# Altium integrated library Weidmueller_OMNIMATE_Power.IntLib: 508 symbols (part 7 of 9) (continued)
## 1851060000_Single (continued)
OMNIMATE Power - series BU/SU 10.16HP; PartNumber: 1851060000; Manufacturer: Weidmueller; Short_text_for_material: SU 10.16HP/04/90SF 3.5AG BK BX; Side_termination_characteristic: Screw/clip-on flange; Mounting_onto_the_PCB: Solder connection; Pitch_mm: 10.16 mm; Pitch_inch: 0.4 inch; No_of_poles: 4; Outgoing_elbow: 90°; Solder_pin_length_mm: 3.5 mm; Contact_material: Cu-Leg; Contact_surface: silver-plated; Insulating_material: PBT GF; UL_94_flammability_rating: V-0; Rated_voltage_for_surge_voltage_class_pollution_degree_II_2: 1000 V; Rated_current_min_no_of_poles_TU_20_deg_C: 19 A; Rated_voltage_use_group_B_UL_1059: 300 V; Rated_current_use_group_B_UL_1059: 54 A; PackageReference: SU_10_16HP_90SF_04; Colour: Black; Packaging: Box; Qty: 50 PCS; Revision: V1; ComponentLink1Description: Manufacturer URL; ComponentLink1URL: http://www.weidmueller.com/; ComponentLink2Description: URL Link1; ComponentLink2URL: http://catalog.weidmueller.com/catalog/Start.do?localeId=en&ObjectID=1851060000
footprint SU_10_16HP_90SF_04 (OMNIMATE Power - Serie BU/SU 10.16HP  SU 10.16HP/04/90SF 3.5)
part A pins: A1
part B pins: A2
part C pins: A3
part D pins: A4

## 1851100000
designator J?
OMNIMATE Power - series BU/SU 10.16HP; PartNumber: 1851100000; Manufacturer: Weidmueller; Short_text_for_material: SU 10.16HP/08/90SF 3.5AG BK BX; Side_termination_characteristic: Screw/clip-on flange; Mounting_onto_the_PCB: Solder connection; Pitch_mm: 10.16 mm; Pitch_inch: 0.4 inch; No_of_poles: 8; Outgoing_elbow: 90°; Solder_pin_length_mm: 3.5 mm; Contact_material: Cu-Leg; Contact_surface: silver-plated; Insulating_material: PBT GF; UL_94_flammability_rating: V-0; Rated_voltage_for_surge_voltage_class_pollution_degree_II_2: 1000 V; Rated_current_min_no_of_poles_TU_20_deg_C: 19 A; Rated_voltage_use_group_B_UL_1059: 300 V; Rated_current_use_group_B_UL_1059: 54 A; PackageReference: SU_10_16HP_90SF_08; Colour: Black; Packaging: Box; Qty: 20 PCS; Revision: V1; ComponentLink1Description: Manufacturer URL; ComponentLink1URL: http://www.weidmueller.com/; ComponentLink2Description: URL Link1; ComponentLink2URL: http://catalog.weidmueller.com/catalog/Start.do?localeId=en&ObjectID=1851100000
footprint SU_10_16HP_90SF_08 (OMNIMATE Power - Serie BU/SU 10.16HP  SU 10.16HP/08/90SF 3.5)
pins: A1, A2, A3, A4, A5, A6, A7, A8

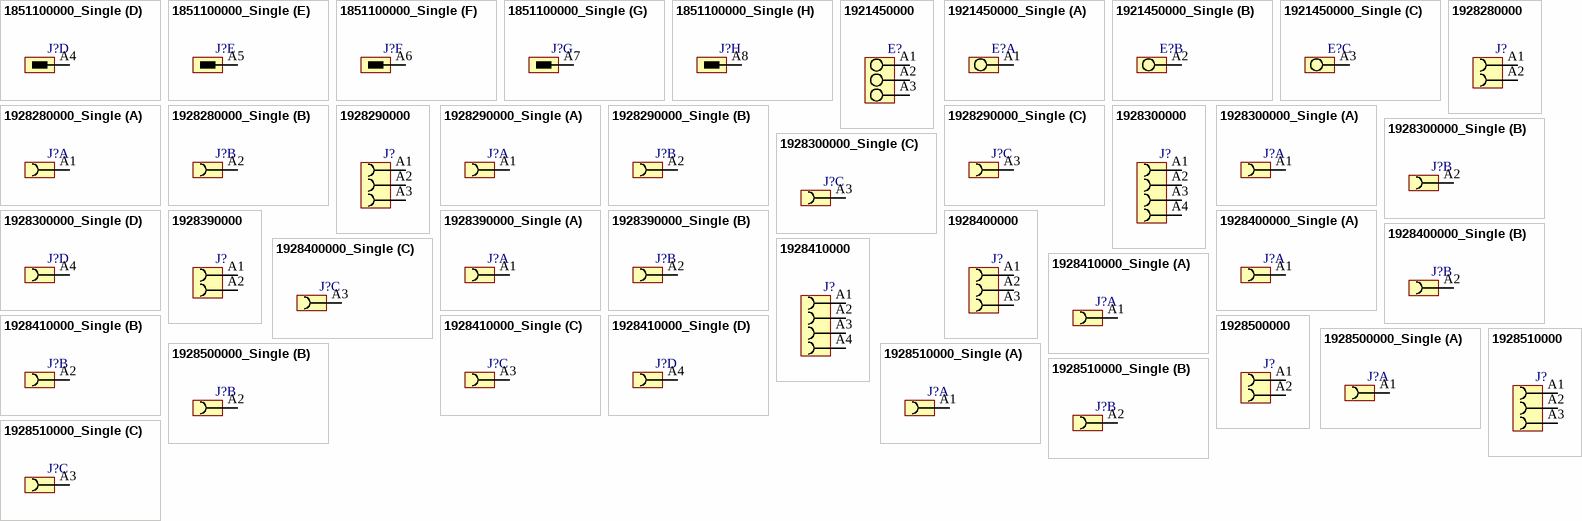
[diagram p25: symbols 1851100000_Single to 1928510000_Single]

## 1851100000_Single
designator J?
OMNIMATE Power - series BU/SU 10.16HP; PartNumber: 1851100000; Manufacturer: Weidmueller; Short_text_for_material: SU 10.16HP/08/90SF 3.5AG BK BX; Side_termination_characteristic: Screw/clip-on flange; Mounting_onto_the_PCB: Solder connection; Pitch_mm: 10.16 mm; Pitch_inch: 0.4 inch; No_of_poles: 8; Outgoing_elbow: 90°; Solder_pin_length_mm: 3.5 mm; Contact_material: Cu-Leg; Contact_surface: silver-plated; Insulating_material: PBT GF; UL_94_flammability_rating: V-0; Rated_voltage_for_surge_voltage_class_pollution_degree_II_2: 1000 V; Rated_current_min_no_of_poles_TU_20_deg_C: 19 A; Rated_voltage_use_group_B_UL_1059: 300 V; Rated_current_use_group_B_UL_1059: 54 A; PackageReference: SU_10_16HP_90SF_08; Colour: Black; Packaging: Box; Qty: 20 PCS; Revision: V1; ComponentLink1Description: Manufacturer URL; ComponentLink1URL: http://www.weidmueller.com/; ComponentLink2Description: URL Link1; ComponentLink2URL: http://catalog.weidmueller.com/catalog/Start.do?localeId=en&ObjectID=1851100000
footprint SU_10_16HP_90SF_08 (OMNIMATE Power - Serie BU/SU 10.16HP  SU 10.16HP/08/90SF 3.5)
part A pins: A1
part B pins: A2
part C pins: A3
part D pins: A4
part E pins: A5
part F pins: A6
part G pins: A7
part H pins: A8

## 1921450000
designator E?
OMNIMATE Power - series LU; PartNumber: 1921450000; Manufacturer: Weidmueller; Short_text_for_material: LU 10.16/03/90 4.5SN BK BX; Side_termination_characteristic: closed side; Mounting_onto_the_PCB: Solder connection; Pitch_mm: 10,16 mm; Pitch_inch: 0,4 inch; No_of_poles: 3; Solder_pin_length_mm: 4,5 mm; Contact_material: E-Cu; Contact_surface: tinned; Insulating_material: Wemid (PA); UL_94_flammability_rating: V-0; Rated_voltage_for_surge_voltage_class_pollution_degree_II_2: 1000 V; Solid_min_H05_07_V_U: 0,5 mm²; Solid_max_H05_07_V_U: 16 mm²; Rated_voltage_use_group_B_UL_1059: 300 V; Rated_current_use_group_B_UL_1059: 65 A; Wire_cross_section_AWG_min_UL_1059: AWG 26; Wire_cross_section_AWG_max_UL_1059: AWG 6; PackageReference: LU_10_16_90_03; Colour: Black; Packaging: Box; Qty: 20 PCS; Revision: V1; ComponentLink1Description: Manufacturer URL; ComponentLink1URL: http://www.weidmueller.com/; ComponentLink2Description: URL Link1; ComponentLink2URL: http://catalog.weidmueller.com/catalog/Start.do?localeId=en&ObjectID=1921450000
footprint LU_10_16_90_03 (OMNIMATE Power - Serie LU  LU 10.16/03/90 4.5)
pins: A1, A2, A3
1 alternate drawing of the same symbol

## 1921450000_Single
designator E?
OMNIMATE Power - series LU; PartNumber: 1921450000; Manufacturer: Weidmueller; Short_text_for_material: LU 10.16/03/90 4.5SN BK BX; Side_termination_characteristic: closed side; Mounting_onto_the_PCB: Solder connection; Pitch_mm: 10,16 mm; Pitch_inch: 0,4 inch; No_of_poles: 3; Solder_pin_length_mm: 4,5 mm; Contact_material: E-Cu; Contact_surface: tinned; Insulating_material: Wemid (PA); UL_94_flammability_rating: V-0; Rated_voltage_for_surge_voltage_class_pollution_degree_II_2: 1000 V; Solid_min_H05_07_V_U: 0,5 mm²; Solid_max_H05_07_V_U: 16 mm²; Rated_voltage_use_group_B_UL_1059: 300 V; Rated_current_use_group_B_UL_1059: 65 A; Wire_cross_section_AWG_min_UL_1059: AWG 26; Wire_cross_section_AWG_max_UL_1059: AWG 6; PackageReference: LU_10_16_90_03; Colour: Black; Packaging: Box; Qty: 20 PCS; Revision: V1; ComponentLink1Description: Manufacturer URL; ComponentLink1URL: http://www.weidmueller.com/; ComponentLink2Description: URL Link1; ComponentLink2URL: http://catalog.weidmueller.com/catalog/Start.do?localeId=en&ObjectID=1921450000
footprint LU_10_16_90_03 (OMNIMATE Power - Serie LU  LU 10.16/03/90 4.5)
part A pins: A1
part B pins: A2
part C pins: A3
1 alternate drawing of the same symbol

## 1928280000
designator J?
OMNIMATE Power - series BV/SV 7.62HP; PartNumber: 1928280000; Manufacturer: Weidmueller; Short_text_for_material: BVL 7.62HP/02/90 3.5SN BK BX; Side_termination_characteristic: closed side; Mounting_onto_the_PCB: Solder connection; Pitch_mm: 7.62 mm; Pitch_inch: 0.3 inch; No_of_poles: 2; Outgoing_elbow: 90°; Solder_pin_length_mm: 3.5 mm; Contact_material: Cu-Leg; Contact_surface: tinned; Insulating_material: PA GF; UL_94_flammability_rating: V-0; Rated_voltage_for_surge_voltage_class_pollution_degree_II_2: 1000 V; Rated_voltage_use_group_B_UL_1059: 300 V; Rated_current_use_group_B_UL_1059: 35 A; PackageReference: BVL_7_62HP_90_02; Colour: Black; Packaging: Box; Qty: 100 PCS; Revision: V1; ComponentLink1Description: Manufacturer URL; ComponentLink1URL: http://www.weidmueller.com/; ComponentLink2Description: URL Link1; ComponentLink2URL: http://catalog.weidmueller.com/catalog/Start.do?localeId=en&ObjectID=1928280000
footprint BVL_7_62HP_90_02 (OMNIMATE Power - Serie BV/SV 7.62HP  BVL 7.62HP/02/90 3.5)
pins: A1, A2

## 1928280000_Single
designator J?
OMNIMATE Power - series BV/SV 7.62HP; PartNumber: 1928280000; Manufacturer: Weidmueller; Short_text_for_material: BVL 7.62HP/02/90 3.5SN BK BX; Side_termination_characteristic: closed side; Mounting_onto_the_PCB: Solder connection; Pitch_mm: 7.62 mm; Pitch_inch: 0.3 inch; No_of_poles: 2; Outgoing_elbow: 90°; Solder_pin_length_mm: 3.5 mm; Contact_material: Cu-Leg; Contact_surface: tinned; Insulating_material: PA GF; UL_94_flammability_rating: V-0; Rated_voltage_for_surge_voltage_class_pollution_degree_II_2: 1000 V; Rated_voltage_use_group_B_UL_1059: 300 V; Rated_current_use_group_B_UL_1059: 35 A; PackageReference: BVL_7_62HP_90_02; Colour: Black; Packaging: Box; Qty: 100 PCS; Revision: V1; ComponentLink1Description: Manufacturer URL; ComponentLink1URL: http://www.weidmueller.com/; ComponentLink2Description: URL Link1; ComponentLink2URL: http://catalog.weidmueller.com/catalog/Start.do?localeId=en&ObjectID=1928280000
footprint BVL_7_62HP_90_02 (OMNIMATE Power - Serie BV/SV 7.62HP  BVL 7.62HP/02/90 3.5)
part A pins: A1
part B pins: A2

## 1928290000
designator J?
OMNIMATE Power - series BV/SV 7.62HP; PartNumber: 1928290000; Manufacturer: Weidmueller; Short_text_for_material: BVL 7.62HP/03/90 3.5SN BK BX; Side_termination_characteristic: closed side; Mounting_onto_the_PCB: Solder connection; Pitch_mm: 7.62 mm; Pitch_inch: 0.3 inch; No_of_poles: 3; Outgoing_elbow: 90°; Solder_pin_length_mm: 3.5 mm; Contact_material: Cu-Leg; Contact_surface: tinned; Insulating_material: PA GF; UL_94_flammability_rating: V-0; Rated_voltage_for_surge_voltage_class_pollution_degree_II_2: 1000 V; Rated_voltage_use_group_B_UL_1059: 300 V; Rated_current_use_group_B_UL_1059: 35 A; PackageReference: BVL_7_62HP_90_03; Colour: Black; Packaging: Box; Qty: 100 PCS; Revision: V1; ComponentLink1Description: Manufacturer URL; ComponentLink1URL: http://www.weidmueller.com/; ComponentLink2Description: URL Link1; ComponentLink2URL: http://catalog.weidmueller.com/catalog/Start.do?localeId=en&ObjectID=1928290000
footprint BVL_7_62HP_90_03 (OMNIMATE Power - Serie BV/SV 7.62HP  BVL 7.62HP/03/90 3.5)
pins: A1, A2, A3

## 1928290000_Single
designator J?
OMNIMATE Power - series BV/SV 7.62HP; PartNumber: 1928290000; Manufacturer: Weidmueller; Short_text_for_material: BVL 7.62HP/03/90 3.5SN BK BX; Side_termination_characteristic: closed side; Mounting_onto_the_PCB: Solder connection; Pitch_mm: 7.62 mm; Pitch_inch: 0.3 inch; No_of_poles: 3; Outgoing_elbow: 90°; Solder_pin_length_mm: 3.5 mm; Contact_material: Cu-Leg; Contact_surface: tinned; Insulating_material: PA GF; UL_94_flammability_rating: V-0; Rated_voltage_for_surge_voltage_class_pollution_degree_II_2: 1000 V; Rated_voltage_use_group_B_UL_1059: 300 V; Rated_current_use_group_B_UL_1059: 35 A; PackageReference: BVL_7_62HP_90_03; Colour: Black; Packaging: Box; Qty: 100 PCS; Revision: V1; ComponentLink1Description: Manufacturer URL; ComponentLink1URL: http://www.weidmueller.com/; ComponentLink2Description: URL Link1; ComponentLink2URL: http://catalog.weidmueller.com/catalog/Start.do?localeId=en&ObjectID=1928290000
footprint BVL_7_62HP_90_03 (OMNIMATE Power - Serie BV/SV 7.62HP  BVL 7.62HP/03/90 3.5)
part A pins: A1
part B pins: A2
part C pins: A3

## 1928300000
designator J?
OMNIMATE Power - series BV/SV 7.62HP; PartNumber: 1928300000; Manufacturer: Weidmueller; Short_text_for_material: BVL 7.62HP/04/90 3.5SN BK BX; Side_termination_characteristic: closed side; Mounting_onto_the_PCB: Solder connection; Pitch_mm: 7.62 mm; Pitch_inch: 0.3 inch; No_of_poles: 4; Outgoing_elbow: 90°; Solder_pin_length_mm: 3.5 mm; Contact_material: Cu-Leg; Contact_surface: tinned; Insulating_material: PA GF; UL_94_flammability_rating: V-0; Rated_voltage_for_surge_voltage_class_pollution_degree_II_2: 1000 V; Rated_voltage_use_group_B_UL_1059: 300 V; Rated_current_use_group_B_UL_1059: 35 A; PackageReference: BVL_7_62HP_90_04; Colour: Black; Packaging: Box; Qty: 100 PCS; Revision: V1; ComponentLink1Description: Manufacturer URL; ComponentLink1URL: http://www.weidmueller.com/; ComponentLink2Description: URL Link1; ComponentLink2URL: http://catalog.weidmueller.com/catalog/Start.do?localeId=en&ObjectID=1928300000
footprint BVL_7_62HP_90_04 (OMNIMATE Power - Serie BV/SV 7.62HP  BVL 7.62HP/04/90 3.5)
pins: A1, A2, A3, A4

## 1928300000_Single
designator J?
OMNIMATE Power - series BV/SV 7.62HP; PartNumber: 1928300000; Manufacturer: Weidmueller; Short_text_for_material: BVL 7.62HP/04/90 3.5SN BK BX; Side_termination_characteristic: closed side; Mounting_onto_the_PCB: Solder connection; Pitch_mm: 7.62 mm; Pitch_inch: 0.3 inch; No_of_poles: 4; Outgoing_elbow: 90°; Solder_pin_length_mm: 3.5 mm; Contact_material: Cu-Leg; Contact_surface: tinned; Insulating_material: PA GF; UL_94_flammability_rating: V-0; Rated_voltage_for_surge_voltage_class_pollution_degree_II_2: 1000 V; Rated_voltage_use_group_B_UL_1059: 300 V; Rated_current_use_group_B_UL_1059: 35 A; PackageReference: BVL_7_62HP_90_04; Colour: Black; Packaging: Box; Qty: 100 PCS; Revision: V1; ComponentLink1Description: Manufacturer URL; ComponentLink1URL: http://www.weidmueller.com/; ComponentLink2Description: URL Link1; ComponentLink2URL: http://catalog.weidmueller.com/catalog/Start.do?localeId=en&ObjectID=1928300000
footprint BVL_7_62HP_90_04 (OMNIMATE Power - Serie BV/SV 7.62HP  BVL 7.62HP/04/90 3.5)
part A pins: A1
part B pins: A2
part C pins: A3
part D pins: A4

## 1928390000
designator J?
OMNIMATE Power - series BV/SV 7.62HP; PartNumber: 1928390000; Manufacturer: Weidmueller; Short_text_for_material: BVL 7.62HP/02/90FI 3.5SN BK BX; Side_termination_characteristic: Clip-on flange, inverted; Mounting_onto_the_PCB: Solder connection; Pitch_mm: 7.62 mm; Pitch_inch: 0.3 inch; No_of_poles: 2; Outgoing_elbow: 90°; Solder_pin_length_mm: 3.5 mm; Contact_material: Cu-Leg; Contact_surface: tinned; Insulating_material: PA GF; UL_94_flammability_rating: V-0; Rated_voltage_for_surge_voltage_class_pollution_degree_II_2: 1000 V; Rated_voltage_use_group_B_UL_1059: 300 V; Rated_current_use_group_B_UL_1059: 35 A; PackageReference: BVL_7_62HP_90FI_02; Colour: Black; Packaging: Box; Qty: 100 PCS; Revision: V1; ComponentLink1Description: Manufacturer URL; ComponentLink1URL: http://www.weidmueller.com/; ComponentLink2Description: URL Link1; ComponentLink2URL: http://catalog.weidmueller.com/catalog/Start.do?localeId=en&ObjectID=1928390000
footprint BVL_7_62HP_90FI_02 (OMNIMATE Power - Serie BV/SV 7.62HP  BVL 7.62HP/02/90FI 3.5)
pins: A1, A2

## 1928390000_Single
designator J?
OMNIMATE Power - series BV/SV 7.62HP; PartNumber: 1928390000; Manufacturer: Weidmueller; Short_text_for_material: BVL 7.62HP/02/90FI 3.5SN BK BX; Side_termination_characteristic: Clip-on flange, inverted; Mounting_onto_the_PCB: Solder connection; Pitch_mm: 7.62 mm; Pitch_inch: 0.3 inch; No_of_poles: 2; Outgoing_elbow: 90°; Solder_pin_length_mm: 3.5 mm; Contact_material: Cu-Leg; Contact_surface: tinned; Insulating_material: PA GF; UL_94_flammability_rating: V-0; Rated_voltage_for_surge_voltage_class_pollution_degree_II_2: 1000 V; Rated_voltage_use_group_B_UL_1059: 300 V; Rated_current_use_group_B_UL_1059: 35 A; PackageReference: BVL_7_62HP_90FI_02; Colour: Black; Packaging: Box; Qty: 100 PCS; Revision: V1; ComponentLink1Description: Manufacturer URL; ComponentLink1URL: http://www.weidmueller.com/; ComponentLink2Description: URL Link1; ComponentLink2URL: http://catalog.weidmueller.com/catalog/Start.do?localeId=en&ObjectID=1928390000
footprint BVL_7_62HP_90FI_02 (OMNIMATE Power - Serie BV/SV 7.62HP  BVL 7.62HP/02/90FI 3.5)
part A pins: A1
part B pins: A2

## 1928400000
designator J?
OMNIMATE Power - series BV/SV 7.62HP; PartNumber: 1928400000; Manufacturer: Weidmueller; Short_text_for_material: BVL 7.62HP/03/90FI 3.5SN BK BX; Side_termination_characteristic: Clip-on flange, inverted; Mounting_onto_the_PCB: Solder connection; Pitch_mm: 7.62 mm; Pitch_inch: 0.3 inch; No_of_poles: 3; Outgoing_elbow: 90°; Solder_pin_length_mm: 3.5 mm; Contact_material: Cu-Leg; Contact_surface: tinned; Insulating_material: PA GF; UL_94_flammability_rating: V-0; Rated_voltage_for_surge_voltage_class_pollution_degree_II_2: 1000 V; Rated_voltage_use_group_B_UL_1059: 300 V; Rated_current_use_group_B_UL_1059: 35 A; PackageReference: BVL_7_62HP_90FI_03; Colour: Black; Packaging: Box; Qty: 100 PCS; Revision: V1; ComponentLink1Description: Manufacturer URL; ComponentLink1URL: http://www.weidmueller.com/; ComponentLink2Description: URL Link1; ComponentLink2URL: http://catalog.weidmueller.com/catalog/Start.do?localeId=en&ObjectID=1928400000
footprint BVL_7_62HP_90FI_03 (OMNIMATE Power - Serie BV/SV 7.62HP  BVL 7.62HP/03/90FI 3.5)
pins: A1, A2, A3

## 1928400000_Single
designator J?
OMNIMATE Power - series BV/SV 7.62HP; PartNumber: 1928400000; Manufacturer: Weidmueller; Short_text_for_material: BVL 7.62HP/03/90FI 3.5SN BK BX; Side_termination_characteristic: Clip-on flange, inverted; Mounting_onto_the_PCB: Solder connection; Pitch_mm: 7.62 mm; Pitch_inch: 0.3 inch; No_of_poles: 3; Outgoing_elbow: 90°; Solder_pin_length_mm: 3.5 mm; Contact_material: Cu-Leg; Contact_surface: tinned; Insulating_material: PA GF; UL_94_flammability_rating: V-0; Rated_voltage_for_surge_voltage_class_pollution_degree_II_2: 1000 V; Rated_voltage_use_group_B_UL_1059: 300 V; Rated_current_use_group_B_UL_1059: 35 A; PackageReference: BVL_7_62HP_90FI_03; Colour: Black; Packaging: Box; Qty: 100 PCS; Revision: V1; ComponentLink1Description: Manufacturer URL; ComponentLink1URL: http://www.weidmueller.com/; ComponentLink2Description: URL Link1; ComponentLink2URL: http://catalog.weidmueller.com/catalog/Start.do?localeId=en&ObjectID=1928400000
footprint BVL_7_62HP_90FI_03 (OMNIMATE Power - Serie BV/SV 7.62HP  BVL 7.62HP/03/90FI 3.5)
part A pins: A1
part B pins: A2
part C pins: A3

## 1928410000
designator J?
OMNIMATE Power - series BV/SV 7.62HP; PartNumber: 1928410000; Manufacturer: Weidmueller; Short_text_for_material: BVL 7.62HP/04/90FI 3.5SN BK BX; Side_termination_characteristic: Clip-on flange, inverted; Mounting_onto_the_PCB: Solder connection; Pitch_mm: 7.62 mm; Pitch_inch: 0.3 inch; No_of_poles: 4; Outgoing_elbow: 90°; Solder_pin_length_mm: 3.5 mm; Contact_material: Cu-Leg; Contact_surface: tinned; Insulating_material: PA GF; UL_94_flammability_rating: V-0; Rated_voltage_for_surge_voltage_class_pollution_degree_II_2: 1000 V; Rated_voltage_use_group_B_UL_1059: 300 V; Rated_current_use_group_B_UL_1059: 35 A; PackageReference: BVL_7_62HP_90FI_04; Colour: Black; Packaging: Box; Qty: 100 PCS; Revision: V1; ComponentLink1Description: Manufacturer URL; ComponentLink1URL: http://www.weidmueller.com/; ComponentLink2Description: URL Link1; ComponentLink2URL: http://catalog.weidmueller.com/catalog/Start.do?localeId=en&ObjectID=1928410000
footprint BVL_7_62HP_90FI_04 (OMNIMATE Power - Serie BV/SV 7.62HP  BVL 7.62HP/04/90FI 3.5)
pins: A1, A2, A3, A4

## 1928410000_Single
designator J?
OMNIMATE Power - series BV/SV 7.62HP; PartNumber: 1928410000; Manufacturer: Weidmueller; Short_text_for_material: BVL 7.62HP/04/90FI 3.5SN BK BX; Side_termination_characteristic: Clip-on flange, inverted; Mounting_onto_the_PCB: Solder connection; Pitch_mm: 7.62 mm; Pitch_inch: 0.3 inch; No_of_poles: 4; Outgoing_elbow: 90°; Solder_pin_length_mm: 3.5 mm; Contact_material: Cu-Leg; Contact_surface: tinned; Insulating_material: PA GF; UL_94_flammability_rating: V-0; Rated_voltage_for_surge_voltage_class_pollution_degree_II_2: 1000 V; Rated_voltage_use_group_B_UL_1059: 300 V; Rated_current_use_group_B_UL_1059: 35 A; PackageReference: BVL_7_62HP_90FI_04; Colour: Black; Packaging: Box; Qty: 100 PCS; Revision: V1; ComponentLink1Description: Manufacturer URL; ComponentLink1URL: http://www.weidmueller.com/; ComponentLink2Description: URL Link1; ComponentLink2URL: http://catalog.weidmueller.com/catalog/Start.do?localeId=en&ObjectID=1928410000
footprint BVL_7_62HP_90FI_04 (OMNIMATE Power - Serie BV/SV 7.62HP  BVL 7.62HP/04/90FI 3.5)
part A pins: A1
part B pins: A2
part C pins: A3
part D pins: A4

## 1928500000
designator J?
OMNIMATE Power - series BV/SV 7.62HP; PartNumber: 1928500000; Manufacturer: Weidmueller; Short_text_for_material: BVL 7.62HP/02/90SFI 3.5SN BK BX; Side_termination_characteristic: Screw/clip-on flange, reversed; Mounting_onto_the_PCB: Solder connection; Pitch_mm: 7.62 mm; Pitch_inch: 0.3 inch; No_of_poles: 2; Outgoing_elbow: 90°; Solder_pin_length_mm: 3.5 mm; Contact_material: Cu-Leg; Contact_surface: tinned; Insulating_material: PA GF; UL_94_flammability_rating: V-0; Rated_voltage_for_surge_voltage_class_pollution_degree_II_2: 1000 V; Rated_voltage_use_group_B_UL_1059: 300 V; Rated_current_use_group_B_UL_1059: 35 A; PackageReference: BVL_7_62HP_90SFI_02; Colour: Black; Packaging: Box; Qty: 100 PCS; Revision: V1; ComponentLink1Description: Manufacturer URL; ComponentLink1URL: http://www.weidmueller.com/; ComponentLink2Description: URL Link1; ComponentLink2URL: http://catalog.weidmueller.com/catalog/Start.do?localeId=en&ObjectID=1928500000
footprint BVL_7_62HP_90SFI_02 (OMNIMATE Power - Serie BV/SV 7.62HP  BVL 7.62HP/02/90SFI 3.5)
pins: A1, A2

## 1928500000_Single
designator J?
OMNIMATE Power - series BV/SV 7.62HP; PartNumber: 1928500000; Manufacturer: Weidmueller; Short_text_for_material: BVL 7.62HP/02/90SFI 3.5SN BK BX; Side_termination_characteristic: Screw/clip-on flange, reversed; Mounting_onto_the_PCB: Solder connection; Pitch_mm: 7.62 mm; Pitch_inch: 0.3 inch; No_of_poles: 2; Outgoing_elbow: 90°; Solder_pin_length_mm: 3.5 mm; Contact_material: Cu-Leg; Contact_surface: tinned; Insulating_material: PA GF; UL_94_flammability_rating: V-0; Rated_voltage_for_surge_voltage_class_pollution_degree_II_2: 1000 V; Rated_voltage_use_group_B_UL_1059: 300 V; Rated_current_use_group_B_UL_1059: 35 A; PackageReference: BVL_7_62HP_90SFI_02; Colour: Black; Packaging: Box; Qty: 100 PCS; Revision: V1; ComponentLink1Description: Manufacturer URL; ComponentLink1URL: http://www.weidmueller.com/; ComponentLink2Description: URL Link1; ComponentLink2URL: http://catalog.weidmueller.com/catalog/Start.do?localeId=en&ObjectID=1928500000
footprint BVL_7_62HP_90SFI_02 (OMNIMATE Power - Serie BV/SV 7.62HP  BVL 7.62HP/02/90SFI 3.5)
part A pins: A1
part B pins: A2

## 1928510000
designator J?
OMNIMATE Power - series BV/SV 7.62HP; PartNumber: 1928510000; Manufacturer: Weidmueller; Short_text_for_material: BVL 7.62HP/03/90SFI 3.5SN BK BX; Side_termination_characteristic: Screw/clip-on flange, reversed; Mounting_onto_the_PCB: Solder connection; Pitch_mm: 7.62 mm; Pitch_inch: 0.3 inch; No_of_poles: 3; Outgoing_elbow: 90°; Solder_pin_length_mm: 3.5 mm; Contact_material: Cu-Leg; Contact_surface: tinned; Insulating_material: PA GF; UL_94_flammability_rating: V-0; Rated_voltage_for_surge_voltage_class_pollution_degree_II_2: 1000 V; Rated_voltage_use_group_B_UL_1059: 300 V; Rated_current_use_group_B_UL_1059: 35 A; PackageReference: BVL_7_62HP_90SFI_03; Colour: Black; Packaging: Box; Qty: 100 PCS; Revision: V1; ComponentLink1Description: Manufacturer URL; ComponentLink1URL: http://www.weidmueller.com/; ComponentLink2Description: URL Link1; ComponentLink2URL: http://catalog.weidmueller.com/catalog/Start.do?localeId=en&ObjectID=1928510000
footprint BVL_7_62HP_90SFI_03 (OMNIMATE Power - Serie BV/SV 7.62HP  BVL 7.62HP/03/90SFI 3.5)
pins: A1, A2, A3

## 1928510000_Single
designator J?
OMNIMATE Power - series BV/SV 7.62HP; PartNumber: 1928510000; Manufacturer: Weidmueller; Short_text_for_material: BVL 7.62HP/03/90SFI 3.5SN BK BX; Side_termination_characteristic: Screw/clip-on flange, reversed; Mounting_onto_the_PCB: Solder connection; Pitch_mm: 7.62 mm; Pitch_inch: 0.3 inch; No_of_poles: 3; Outgoing_elbow: 90°; Solder_pin_length_mm: 3.5 mm; Contact_material: Cu-Leg; Contact_surface: tinned; Insulating_material: PA GF; UL_94_flammability_rating: V-0; Rated_voltage_for_surge_voltage_class_pollution_degree_II_2: 1000 V; Rated_voltage_use_group_B_UL_1059: 300 V; Rated_current_use_group_B_UL_1059: 35 A; PackageReference: BVL_7_62HP_90SFI_03; Colour: Black; Packaging: Box; Qty: 100 PCS; Revision: V1; ComponentLink1Description: Manufacturer URL; ComponentLink1URL: http://www.weidmueller.com/; ComponentLink2Description: URL Link1; ComponentLink2URL: http://catalog.weidmueller.com/catalog/Start.do?localeId=en&ObjectID=1928510000
footprint BVL_7_62HP_90SFI_03 (OMNIMATE Power - Serie BV/SV 7.62HP  BVL 7.62HP/03/90SFI 3.5)
part A pins: A1
part B pins: A2
part C pins: A3

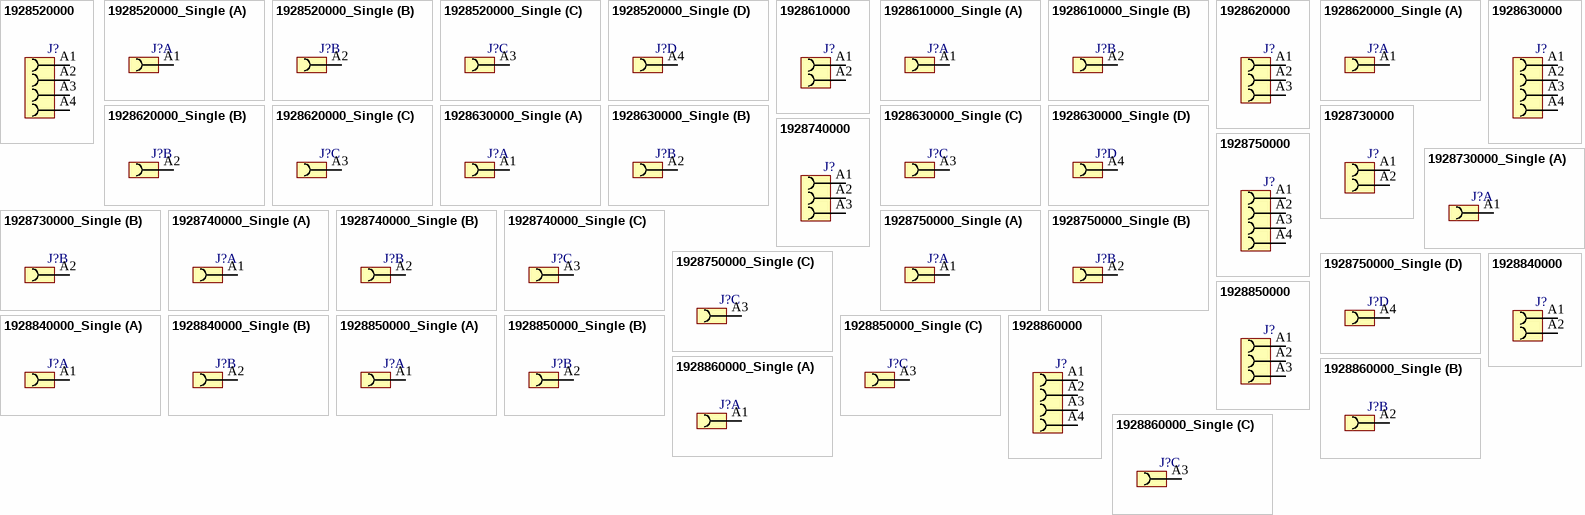
[diagram p26: symbols 1928520000 to 1928860000_Single]

## 1928520000
designator J?
OMNIMATE Power - series BV/SV 7.62HP; PartNumber: 1928520000; Manufacturer: Weidmueller; Short_text_for_material: BVL 7.62HP/04/90SFI 3.5SN BK BX; Side_termination_characteristic: Screw/clip-on flange, reversed; Mounting_onto_the_PCB: Solder connection; Pitch_mm: 7.62 mm; Pitch_inch: 0.3 inch; No_of_poles: 4; Outgoing_elbow: 90°; Solder_pin_length_mm: 3.5 mm; Contact_material: Cu-Leg; Contact_surface: tinned; Insulating_material: PA GF; UL_94_flammability_rating: V-0; Rated_voltage_for_surge_voltage_class_pollution_degree_II_2: 1000 V; Rated_voltage_use_group_B_UL_1059: 300 V; Rated_current_use_group_B_UL_1059: 35 A; PackageReference: BVL_7_62HP_90SFI_04; Colour: Black; Packaging: Box; Qty: 100 PCS; Revision: V1; ComponentLink1Description: Manufacturer URL; ComponentLink1URL: http://www.weidmueller.com/; ComponentLink2Description: URL Link1; ComponentLink2URL: http://catalog.weidmueller.com/catalog/Start.do?localeId=en&ObjectID=1928520000
footprint BVL_7_62HP_90SFI_04 (OMNIMATE Power - Serie BV/SV 7.62HP  BVL 7.62HP/04/90SFI 3.5)
pins: A1, A2, A3, A4

## 1928520000_Single
designator J?
OMNIMATE Power - series BV/SV 7.62HP; PartNumber: 1928520000; Manufacturer: Weidmueller; Short_text_for_material: BVL 7.62HP/04/90SFI 3.5SN BK BX; Side_termination_characteristic: Screw/clip-on flange, reversed; Mounting_onto_the_PCB: Solder connection; Pitch_mm: 7.62 mm; Pitch_inch: 0.3 inch; No_of_poles: 4; Outgoing_elbow: 90°; Solder_pin_length_mm: 3.5 mm; Contact_material: Cu-Leg; Contact_surface: tinned; Insulating_material: PA GF; UL_94_flammability_rating: V-0; Rated_voltage_for_surge_voltage_class_pollution_degree_II_2: 1000 V; Rated_voltage_use_group_B_UL_1059: 300 V; Rated_current_use_group_B_UL_1059: 35 A; PackageReference: BVL_7_62HP_90SFI_04; Colour: Black; Packaging: Box; Qty: 100 PCS; Revision: V1; ComponentLink1Description: Manufacturer URL; ComponentLink1URL: http://www.weidmueller.com/; ComponentLink2Description: URL Link1; ComponentLink2URL: http://catalog.weidmueller.com/catalog/Start.do?localeId=en&ObjectID=1928520000
footprint BVL_7_62HP_90SFI_04 (OMNIMATE Power - Serie BV/SV 7.62HP  BVL 7.62HP/04/90SFI 3.5)
part A pins: A1
part B pins: A2
part C pins: A3
part D pins: A4

## 1928610000
designator J?
OMNIMATE Power - series BV/SV 7.62HP; PartNumber: 1928610000; Manufacturer: Weidmueller; Short_text_for_material: BVL 7.62HP/02/180 3.5SN BK BX; Side_termination_characteristic: closed side; Mounting_onto_the_PCB: Solder connection; Pitch_mm: 7.62 mm; Pitch_inch: 0.3 inch; No_of_poles: 2; Outgoing_elbow: 180°; Solder_pin_length_mm: 3.5 mm; Contact_material: Cu-Leg; Contact_surface: tinned; Insulating_material: PA GF; UL_94_flammability_rating: V-0; Rated_voltage_for_surge_voltage_class_pollution_degree_II_2: 1000 V; Rated_voltage_use_group_B_UL_1059: 300 V; Rated_current_use_group_B_UL_1059: 35 A; PackageReference: BVL_7_62HP_180_02; Colour: Black; Packaging: Box; Qty: 100 PCS; Revision: V1; ComponentLink1Description: Manufacturer URL; ComponentLink1URL: http://www.weidmueller.com/; ComponentLink2Description: URL Link1; ComponentLink2URL: http://catalog.weidmueller.com/catalog/Start.do?localeId=en&ObjectID=1928610000
footprint BVL_7_62HP_180_02 (OMNIMATE Power - Serie BV/SV 7.62HP  BVL 7.62HP/02/180 3.5)
pins: A1, A2

## 1928610000_Single
designator J?
OMNIMATE Power - series BV/SV 7.62HP; PartNumber: 1928610000; Manufacturer: Weidmueller; Short_text_for_material: BVL 7.62HP/02/180 3.5SN BK BX; Side_termination_characteristic: closed side; Mounting_onto_the_PCB: Solder connection; Pitch_mm: 7.62 mm; Pitch_inch: 0.3 inch; No_of_poles: 2; Outgoing_elbow: 180°; Solder_pin_length_mm: 3.5 mm; Contact_material: Cu-Leg; Contact_surface: tinned; Insulating_material: PA GF; UL_94_flammability_rating: V-0; Rated_voltage_for_surge_voltage_class_pollution_degree_II_2: 1000 V; Rated_voltage_use_group_B_UL_1059: 300 V; Rated_current_use_group_B_UL_1059: 35 A; PackageReference: BVL_7_62HP_180_02; Colour: Black; Packaging: Box; Qty: 100 PCS; Revision: V1; ComponentLink1Description: Manufacturer URL; ComponentLink1URL: http://www.weidmueller.com/; ComponentLink2Description: URL Link1; ComponentLink2URL: http://catalog.weidmueller.com/catalog/Start.do?localeId=en&ObjectID=1928610000
footprint BVL_7_62HP_180_02 (OMNIMATE Power - Serie BV/SV 7.62HP  BVL 7.62HP/02/180 3.5)
part A pins: A1
part B pins: A2

## 1928620000
designator J?
OMNIMATE Power - series BV/SV 7.62HP; PartNumber: 1928620000; Manufacturer: Weidmueller; Short_text_for_material: BVL 7.62HP/03/180 3.5SN BK BX; Side_termination_characteristic: closed side; Mounting_onto_the_PCB: Solder connection; Pitch_mm: 7.62 mm; Pitch_inch: 0.3 inch; No_of_poles: 3; Outgoing_elbow: 180°; Solder_pin_length_mm: 3.5 mm; Contact_material: Cu-Leg; Contact_surface: tinned; Insulating_material: PA GF; UL_94_flammability_rating: V-0; Rated_voltage_for_surge_voltage_class_pollution_degree_II_2: 1000 V; Rated_voltage_use_group_B_UL_1059: 300 V; Rated_current_use_group_B_UL_1059: 35 A; PackageReference: BVL_7_62HP_180_03; Colour: Black; Packaging: Box; Qty: 100 PCS; Revision: V1; ComponentLink1Description: Manufacturer URL; ComponentLink1URL: http://www.weidmueller.com/; ComponentLink2Description: URL Link1; ComponentLink2URL: http://catalog.weidmueller.com/catalog/Start.do?localeId=en&ObjectID=1928620000
footprint BVL_7_62HP_180_03 (OMNIMATE Power - Serie BV/SV 7.62HP  BVL 7.62HP/03/180 3.5)
pins: A1, A2, A3

## 1928620000_Single
designator J?
OMNIMATE Power - series BV/SV 7.62HP; PartNumber: 1928620000; Manufacturer: Weidmueller; Short_text_for_material: BVL 7.62HP/03/180 3.5SN BK BX; Side_termination_characteristic: closed side; Mounting_onto_the_PCB: Solder connection; Pitch_mm: 7.62 mm; Pitch_inch: 0.3 inch; No_of_poles: 3; Outgoing_elbow: 180°; Solder_pin_length_mm: 3.5 mm; Contact_material: Cu-Leg; Contact_surface: tinned; Insulating_material: PA GF; UL_94_flammability_rating: V-0; Rated_voltage_for_surge_voltage_class_pollution_degree_II_2: 1000 V; Rated_voltage_use_group_B_UL_1059: 300 V; Rated_current_use_group_B_UL_1059: 35 A; PackageReference: BVL_7_62HP_180_03; Colour: Black; Packaging: Box; Qty: 100 PCS; Revision: V1; ComponentLink1Description: Manufacturer URL; ComponentLink1URL: http://www.weidmueller.com/; ComponentLink2Description: URL Link1; ComponentLink2URL: http://catalog.weidmueller.com/catalog/Start.do?localeId=en&ObjectID=1928620000
footprint BVL_7_62HP_180_03 (OMNIMATE Power - Serie BV/SV 7.62HP  BVL 7.62HP/03/180 3.5)
part A pins: A1
part B pins: A2
part C pins: A3

## 1928630000
designator J?
OMNIMATE Power - series BV/SV 7.62HP; PartNumber: 1928630000; Manufacturer: Weidmueller; Short_text_for_material: BVL 7.62HP/04/180 3.5SN BK BX; Side_termination_characteristic: closed side; Mounting_onto_the_PCB: Solder connection; Pitch_mm: 7.62 mm; Pitch_inch: 0.3 inch; No_of_poles: 4; Outgoing_elbow: 180°; Solder_pin_length_mm: 3.5 mm; Contact_material: Cu-Leg; Contact_surface: tinned; Insulating_material: PA GF; UL_94_flammability_rating: V-0; Rated_voltage_for_surge_voltage_class_pollution_degree_II_2: 1000 V; Rated_voltage_use_group_B_UL_1059: 300 V; Rated_current_use_group_B_UL_1059: 35 A; PackageReference: BVL_7_62HP_180_04; Colour: Black; Packaging: Box; Qty: 100 PCS; Revision: V1; ComponentLink1Description: Manufacturer URL; ComponentLink1URL: http://www.weidmueller.com/; ComponentLink2Description: URL Link1; ComponentLink2URL: http://catalog.weidmueller.com/catalog/Start.do?localeId=en&ObjectID=1928630000
footprint BVL_7_62HP_180_04 (OMNIMATE Power - Serie BV/SV 7.62HP  BVL 7.62HP/04/180 3.5)
pins: A1, A2, A3, A4

## 1928630000_Single
designator J?
OMNIMATE Power - series BV/SV 7.62HP; PartNumber: 1928630000; Manufacturer: Weidmueller; Short_text_for_material: BVL 7.62HP/04/180 3.5SN BK BX; Side_termination_characteristic: closed side; Mounting_onto_the_PCB: Solder connection; Pitch_mm: 7.62 mm; Pitch_inch: 0.3 inch; No_of_poles: 4; Outgoing_elbow: 180°; Solder_pin_length_mm: 3.5 mm; Contact_material: Cu-Leg; Contact_surface: tinned; Insulating_material: PA GF; UL_94_flammability_rating: V-0; Rated_voltage_for_surge_voltage_class_pollution_degree_II_2: 1000 V; Rated_voltage_use_group_B_UL_1059: 300 V; Rated_current_use_group_B_UL_1059: 35 A; PackageReference: BVL_7_62HP_180_04; Colour: Black; Packaging: Box; Qty: 100 PCS; Revision: V1; ComponentLink1Description: Manufacturer URL; ComponentLink1URL: http://www.weidmueller.com/; ComponentLink2Description: URL Link1; ComponentLink2URL: http://catalog.weidmueller.com/catalog/Start.do?localeId=en&ObjectID=1928630000
footprint BVL_7_62HP_180_04 (OMNIMATE Power - Serie BV/SV 7.62HP  BVL 7.62HP/04/180 3.5)
part A pins: A1
part B pins: A2
part C pins: A3
part D pins: A4

## 1928730000
designator J?
OMNIMATE Power - series BV/SV 7.62HP; PartNumber: 1928730000; Manufacturer: Weidmueller; Short_text_for_material: BVL 7.62HP/02/180FI 3.5SN BK BX; Side_termination_characteristic: Clip-on flange, inverted; Mounting_onto_the_PCB: Solder connection; Pitch_mm: 7.62 mm; Pitch_inch: 0.3 inch; No_of_poles: 2; Outgoing_elbow: 180°; Solder_pin_length_mm: 3.5 mm; Contact_material: Cu-Leg; Contact_surface: tinned; Insulating_material: PA GF; UL_94_flammability_rating: V-0; Rated_voltage_for_surge_voltage_class_pollution_degree_II_2: 1000 V; Rated_voltage_use_group_B_UL_1059: 300 V; Rated_current_use_group_B_UL_1059: 35 A; PackageReference: BVL_7_62HP_180FI_02; Colour: Black; Packaging: Box; Qty: 100 PCS; Revision: V1; ComponentLink1Description: Manufacturer URL; ComponentLink1URL: http://www.weidmueller.com/; ComponentLink2Description: URL Link1; ComponentLink2URL: http://catalog.weidmueller.com/catalog/Start.do?localeId=en&ObjectID=1928730000
footprint BVL_7_62HP_180FI_02 (OMNIMATE Power - Serie BV/SV 7.62HP  BVL 7.62HP/02/180FI 3.5)
pins: A1, A2

## 1928730000_Single
designator J?
OMNIMATE Power - series BV/SV 7.62HP; PartNumber: 1928730000; Manufacturer: Weidmueller; Short_text_for_material: BVL 7.62HP/02/180FI 3.5SN BK BX; Side_termination_characteristic: Clip-on flange, inverted; Mounting_onto_the_PCB: Solder connection; Pitch_mm: 7.62 mm; Pitch_inch: 0.3 inch; No_of_poles: 2; Outgoing_elbow: 180°; Solder_pin_length_mm: 3.5 mm; Contact_material: Cu-Leg; Contact_surface: tinned; Insulating_material: PA GF; UL_94_flammability_rating: V-0; Rated_voltage_for_surge_voltage_class_pollution_degree_II_2: 1000 V; Rated_voltage_use_group_B_UL_1059: 300 V; Rated_current_use_group_B_UL_1059: 35 A; PackageReference: BVL_7_62HP_180FI_02; Colour: Black; Packaging: Box; Qty: 100 PCS; Revision: V1; ComponentLink1Description: Manufacturer URL; ComponentLink1URL: http://www.weidmueller.com/; ComponentLink2Description: URL Link1; ComponentLink2URL: http://catalog.weidmueller.com/catalog/Start.do?localeId=en&ObjectID=1928730000
footprint BVL_7_62HP_180FI_02 (OMNIMATE Power - Serie BV/SV 7.62HP  BVL 7.62HP/02/180FI 3.5)
part A pins: A1
part B pins: A2

## 1928740000
designator J?
OMNIMATE Power - series BV/SV 7.62HP; PartNumber: 1928740000; Manufacturer: Weidmueller; Short_text_for_material: BVL 7.62HP/03/180FI 3.5SN BK BX; Side_termination_characteristic: Clip-on flange, inverted; Mounting_onto_the_PCB: Solder connection; Pitch_mm: 7.62 mm; Pitch_inch: 0.3 inch; No_of_poles: 3; Outgoing_elbow: 180°; Solder_pin_length_mm: 3.5 mm; Contact_material: Cu-Leg; Contact_surface: tinned; Insulating_material: PA GF; UL_94_flammability_rating: V-0; Rated_voltage_for_surge_voltage_class_pollution_degree_II_2: 1000 V; Rated_voltage_use_group_B_UL_1059: 300 V; Rated_current_use_group_B_UL_1059: 35 A; PackageReference: BVL_7_62HP_180FI_03; Colour: Black; Packaging: Box; Qty: 100 PCS; Revision: V1; ComponentLink1Description: Manufacturer URL; ComponentLink1URL: http://www.weidmueller.com/; ComponentLink2Description: URL Link1; ComponentLink2URL: http://catalog.weidmueller.com/catalog/Start.do?localeId=en&ObjectID=1928740000
footprint BVL_7_62HP_180FI_03 (OMNIMATE Power - Serie BV/SV 7.62HP  BVL 7.62HP/03/180FI 3.5)
pins: A1, A2, A3